# Altium footprint library FTP.PcbLib: 70 footprints (part 4 of 5)
Each footprint in its own frame and in the unit in brackets; x right, y up, seen from the top. Pads: shape width x height; smd on the part's side, far side on the other; paste and mask are expansions set on the pad; w line width, h text height; cw(c..) or ccw(c..) is an arc to the next point about the centre after c.
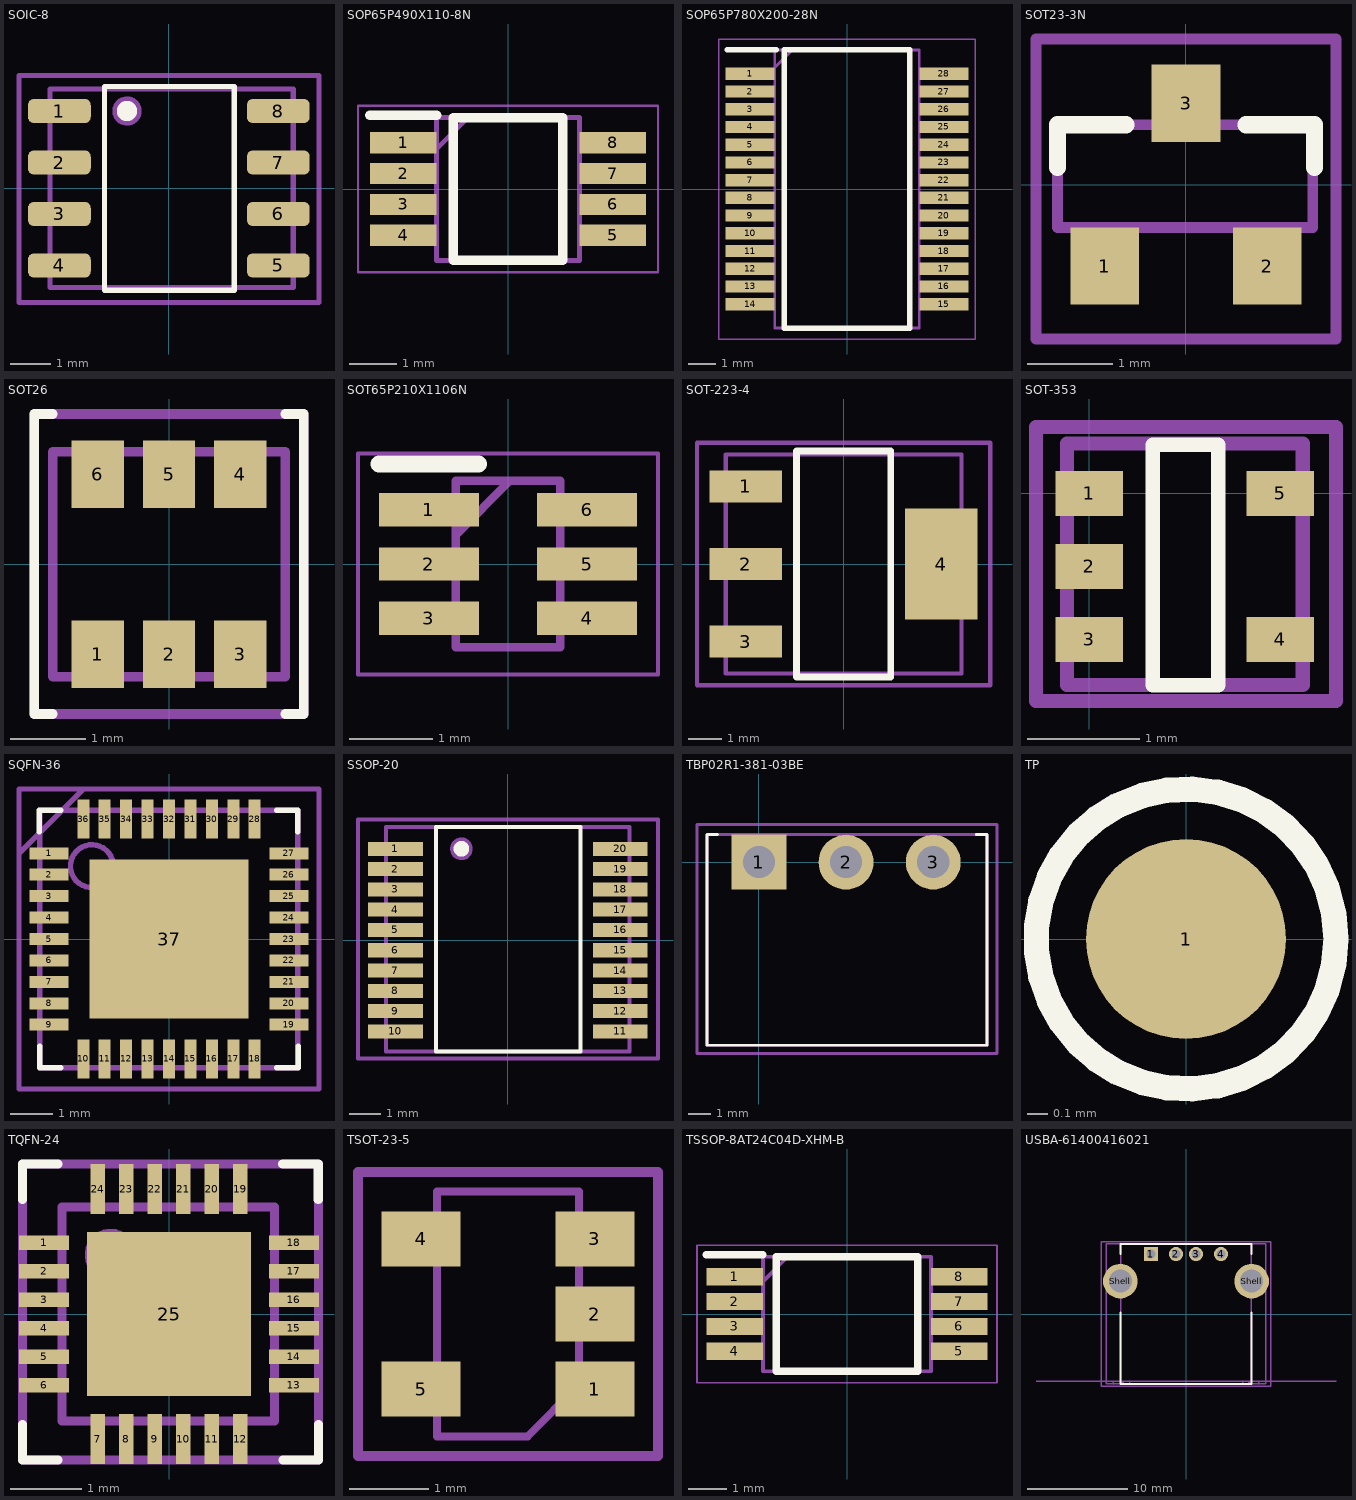
[diagram p3: the footprints below, top view; thin cyan lines are the x and y axes]

## SOIC-8 [mm]
pads (8):
  rrect50% 1.55x0.6 smd mask+0.07: 1(-2.7,1.905) 2(-2.7,0.635) 3(-2.7,-0.635) 4(-2.7,-1.905) 5(2.7,-1.905) 6(2.7,-0.635) 7(2.7,0.635) 8(2.7,1.905)
Top Overlay:
  circle w0.3: c-1.032,1.905 r0.1
  lines w0.127: -1.587,-2.516 -1.587,2.507 1.613,2.507 1.613,-2.516 -1.587,-2.516
  text "." at -4.6,2 h0.76
Mechanical 13:
  circle w0.127: c-1.032,1.905 r0.3
  lines w0.127: -2.932,-2.45 3.068,-2.45 3.068,2.45 -2.932,2.45 -2.932,-2.45
Mechanical 15:
  lines w0.127: -3.696,-2.818 -3.696,2.782 3.704,2.782 3.704,-2.818 -3.696,-2.818
  text "+" at -0.487,-0.757 h1.5
3D body "SOIC-8-1.step": height 1.75, standoff 0, extent -2.932,-2.45 3.068,2.45

## SOP65P490X110-8N [mm]
pads (8):
  rect 1.4x0.45 smd: 1(-2.2,0.975) 2(-2.2,0.325) 3(-2.2,-0.325) 4(-2.2,-0.975) 5(2.2,-0.975) 6(2.2,-0.325) 7(2.2,0.325) 8(2.2,0.975)
Top Overlay:
  lines w0.2: -2.9,1.55 -1.5,1.55 ; -1.15,-1.5 1.15,-1.5 1.15,1.5 -1.15,1.5 -1.15,-1.5
Mechanical 15:
  lines w0.1: -1.5,0.85 -0.85,1.5 ; -1.5,-1.5 1.5,-1.5 1.5,1.5 -1.5,1.5 -1.5,-1.5
Mechanical 20:
  lines w0.05: -3.15,-1.75 3.15,-1.75 3.15,1.75 -3.15,1.75 -3.15,-1.75
3D body "MCP7940NT-E_MS.stp": height 1.1, standoff 0, extent -2.45,-1.5 2.45,1.5

## SOP65P780X200-28N [mm]
pads (28):
  rect 1.8x0.45 smd: 1(-3.55,4.225) 2(-3.55,3.575) 3(-3.55,2.925) 4(-3.55,2.275) 5(-3.55,1.625) 6(-3.55,0.975) 7(-3.55,0.325) 8(-3.55,-0.325) 9(-3.55,-0.975) 10(-3.55,-1.625) 11(-3.55,-2.275) 12(-3.55,-2.925) 13(-3.55,-3.575) 14(-3.55,-4.225) 15(3.55,-4.225) 16(3.55,-3.575) 17(3.55,-2.925) 18(3.55,-2.275) 19(3.55,-1.625) 20(3.55,-0.975) 21(3.55,-0.325) 22(3.55,0.325) 23(3.55,0.975) 24(3.55,1.625) 25(3.55,2.275) 26(3.55,2.925) 27(3.55,3.575) 28(3.55,4.225)
Top Overlay:
  lines w0.2: -4.4,5.1 -2.6,5.1 ; -2.3,-5.1 -2.3,5.1 2.3,5.1 2.3,-5.1 -2.3,-5.1
Mechanical 15:
  lines w0.1: -2.65,4.45 -2,5.1 ; -2.65,-5.1 -2.65,5.1 2.65,5.1 2.65,-5.1 -2.65,-5.1
Mechanical 20:
  lines w0.05: -4.7,-5.5 -4.7,5.5 4.7,5.5 4.7,-5.5 -4.7,-5.5
3D body "PIC16F18857T-I_SS.stp": height 2, standoff 0, extent -3.9,-5.1 3.9,5.1

## SOT23-3N [mm] "SOT23, 3-Leads, Body 2.9x1.3mm, Pitch 0.95mm, Lead Span 2.5mm, IPC Medium Density"
height 1.1
pads (3):
  rect 0.8x0.9 smd: 1(-0.95,-0.95) 2(0.95,-0.95) 3(0,0.95)
Top Overlay:
  lines w0.2: -1.5,0.2 -1.5,0.7 -0.7,0.7 ; 0.7,0.7 1.5,0.7 1.5,0.2
  text "." at -0.874,-2.578 h0.76
Mechanical 13:
  lines w0.127: -1.5,-0.501 -1.5,0.7 1.5,0.7 1.479,0.679 1.479,-0.501 -1.5,-0.501
Mechanical 15:
  lines w0.127: -1.75,-1.8 1.75,-1.8 1.75,1.7 -1.75,1.7 -1.75,-1.8
  text "+" at 0.765,-0.501 h1.5
3D body "SOT23.step": height 0.91, standoff -0.04, extent -1.499,-1.197 1.401,1.204

## SOT26 [mm]
pads (6):
  rect 0.7x0.9 smd mask+0.07: 1(-0.95,-1.2) 2(0,-1.2) 3(0.95,-1.2) 4(0.95,1.2) 5(0,1.2) 6(-0.95,1.2)
Top Overlay:
  lines w0.127: -1.55,-2 -1.8,-2 -1.8,-0.85 -1.8,0.85 -1.8,2.007 -1.55,2.007 ; 1.55,-2 1.8,-2 1.8,-0.85 1.8,0.85 1.8,2.007 1.55,2.007
  text "." at -1.1,-2.4 h0.76
Mechanical 13:
  lines w0.127: -1.55,-1.5 -1.55,1.5 1.55,1.5 1.55,-1.5 -1.55,-1.5
Mechanical 15:
  lines w0.127: -1.8,-2 -1.8,2.007 1.8,2.007 1.8,0.85 1.8,-2 -1.8,-2
  text "+" at -0.493,-0.767 h1.5
3D body "ZXTC2045E6TA.step": height 1.4, standoff 0, extent -1.55,-1.5 1.55,1.5

## SOT65P210X1106N [mm]
pads (6):
  rect 1.2x0.4 smd: 1(-0.95,0.65) 2(-0.95,0) 3(-0.95,-0.65) 4(0.95,-0.65) 5(0.95,0) 6(0.95,0.65)
Top Overlay:
  lines w0.2: -1.55,1.2 -0.35,1.2
Mechanical 15:
  lines w0.1: -0.625,0.35 0.025,1 ; -0.625,-1 0.625,-1 0.625,1 -0.625,1 -0.625,-1
Mechanical 20:
  lines w0.05: -1.8,-1.325 1.8,-1.325 1.8,1.325 -1.8,1.325 -1.8,-1.325
3D body "SN74LVC2G07DCKT.stp": height 1, standoff 0, extent -1.05,-1 1.05,1

## SOT-223-4 [mm]
pads (4):
  rect 2.15x0.95 smd paste+0 mask+0.07: 1(-2.9,2.3) 2(-2.9,0) 3(-2.9,-2.3)
  rect 2.15x3.3 smd paste+0 mask+0.07: 4(2.9,0)
Top Overlay:
  lines w0.2: -1.4,-3.35 -1.4,3.35 1.4,3.35 1.4,-3.35 -1.4,-3.35
  text "." at -5.722,2.286 h0.76
Mechanical 13:
  lines w0.127: -3.5,-3.25 3.5,-3.25 3.5,3.25 -3.5,3.25 -3.5,-3.25
Mechanical 15:
  lines w0.127: -4.35,-3.6 -4.35,3.6 4.35,3.6 4.35,-3.6 -4.35,-3.6
  text "+" at 0.759,-0.515 h1.5
3D body "TLV1117LV33DCYR.stp": height 1.8, standoff 0, extent -3.5,-3.25 3.5,3.25

## SOT-353 [mm] "SOT23, 6-Leads, Body 2,90x2,80mm, Pitch 0,95mm, IPC Medium Density"
height 1
pads (5):
  rect 0.6x0.4 smd mask+0.07: 1(0,0) 2(0,-0.65) 3(0,-1.3) 4(1.7,-1.3) 5(1.7,0)
Top Overlay:
  lines w0.127: 0.563,-1.708 0.563,0.434 1.146,0.434 1.146,-1.708 0.563,-1.708
Mechanical 13:
  lines w0.127: -0.2,-1.706 -0.2,0.444 1.9,0.444 1.9,-1.706 -0.2,-1.706
Mechanical 15:
  lines w0.127: -0.476,-1.849 2.195,-1.849 2.195,0.591 -0.476,0.591 -0.476,-1.849
3D body "SOT353.stp": height 1.02, standoff -0.03, extent -0.2,-1.706 1.9,0.444

## SQFN-36 [mm]
pads (37):
  rect 0.9x0.28 smd: 1(-2.8,2) 2(-2.8,1.5) 3(-2.8,1) 4(-2.8,0.5) 5(-2.8,0) 6(-2.8,-0.5) 7(-2.8,-1) 8(-2.8,-1.5) 9(-2.8,-2) 19(2.8,-2) 20(2.8,-1.5) 21(2.8,-1) 22(2.8,-0.5) 23(2.8,0) 24(2.8,0.5) 25(2.8,1) 26(2.8,1.5) 27(2.8,2)
  rect 0.28x0.9 smd: 10(-2,-2.8) 11(-1.5,-2.8) 12(-1,-2.8) 13(-0.5,-2.8) 14(0,-2.8) 15(0.5,-2.8) 16(1,-2.8) 17(1.5,-2.8) 18(2,-2.8) 28(2,2.8) 29(1.5,2.8) 30(1,2.8) 31(0.5,2.8) 32(0,2.8) 33(-0.5,2.8) 34(-1,2.8) 35(-1.5,2.8) 36(-2,2.8)
  rrect0% 3.7x3.7 smd: 37(0,0)
Top Overlay:
  lines w0.127: -3.026,2.507 -3.026,3.005 -2.528,3.005 ; -3.018,-2.502 -3.018,-3 -2.52,-3 ; 2.51,2.999 3.008,2.999 3.008,2.501 ; 2.513,-3.001 3.011,-3.001 3.011,-2.503
  text "." at -4.2,2 h0.76
Mechanical 13:
  circle w0.127: c-1.8,1.7 r0.5
  lines w0.127: -3.018,-3 3.008,-3 3.008,2.999 -3.018,2.999 -3.018,-3
Mechanical 15:
  lines w0.127: -3.5,2 -2,3.5 ; -3.5,-3.5 -3.5,3.5 3.5,3.5 3.5,-3.5 -3.5,-3.5
  text "+" at -0.495,-0.751 h1.5
3D body "USB2514B_M2.stp": height 1, standoff 0, extent -3.05,-3.05 3.05,3.05

## SSOP-20 [mm]
pads (20):
  rect 1.75x0.45 smd mask+0.07: 1(-3.6,2.925) 2(-3.6,2.275) 3(-3.6,1.625) 4(-3.6,0.975) 5(-3.6,0.325) 6(-3.6,-0.325) 7(-3.6,-0.975) 8(-3.6,-1.625) 9(-3.6,-2.275) 10(-3.6,-2.925) 11(3.6,-2.925) 12(3.6,-2.275) 13(3.6,-1.625) 14(3.6,-0.975) 15(3.6,-0.325) 16(3.6,0.325) 17(3.6,0.975) 18(3.6,1.625) 19(3.6,2.275) 20(3.6,2.925)
Top Overlay:
  circle w0.3: c-1.487,2.925 r0.1
  lines w0.127: -2.3,-3.575 -2.3,3.625 2.328,3.625 2.328,-3.575 -2.3,-3.575
  text "." at -5.7,2.9 h0.76
Mechanical 13:
  circle w0.127: c-1.487,2.925 r0.3
  lines w0.127: -3.9,-3.575 3.9,-3.575 3.9,3.625 -3.9,3.625 -3.9,-3.575
Mechanical 15:
  lines w0.127: -4.8,-3.8 4.813,-3.8 4.813,3.87 -4.8,3.87 -4.8,-3.8
  text "+" at -0.489,-0.75 h1.5
3D body "PIC18F14K22-I_SS.stp": height 2, standoff 0, extent -3.876,-3.601 3.924,3.599

## TBP02R1-381-03BE [mm]
pads (3):
  rect 2.4x2.4 hole 1.4: 1(0,0)
  round 2.4 hole 1.4: 2(3.81,0) 3(7.62,0)
Top Overlay:
  lines w0.127: -1.8,1.2 -2.258,1.2 -2.258,-8 9.962,-8 9.962,1.2 9.5,1.2
  text "." at -0.5,3.5 h0.76
Mechanical 13:
  lines w0.127: -2.258,-8 -2.258,1.2 9.962,1.2 9.962,-8 -2.258,-8
Mechanical 15:
  lines w0.127: -2.7,-8.357 -2.7,1.643 10.405,1.643 10.405,-8.357 -2.7,-8.357
3D body "CUI_DEVICES_TBP02R1-381-03BE.step": height 7.2, standoff -3.5, extent -2.258,-8 9.962,1.2

## TP [mm]
pads (1):
  round 1 smd paste-2 mask+0.1: 1(0,0)
Top Overlay:
  circle w0.127: c0,0 r0.75

## TQFN-24 [mm]
pads (25):
  rect 0.7x0.2 smd mask+0.07: 1(-1.753,1) 2(-1.753,0.6) 3(-1.753,0.2) 4(-1.753,-0.2) 5(-1.753,-0.6) 6(-1.753,-1) 13(1.753,-1) 14(1.753,-0.6) 15(1.753,-0.2) 16(1.753,0.2) 17(1.753,0.6) 18(1.753,1)
  rect 0.2x0.7 smd mask+0.07: 7(-1,-1.753) 8(-0.6,-1.753) 9(-0.2,-1.753) 10(0.2,-1.753) 11(0.6,-1.753) 12(1,-1.753) 19(1,1.753) 20(0.6,1.753) 21(0.2,1.753) 22(-0.2,1.753) 23(-0.6,1.753) 24(-1,1.753)
  rect 2.3x2.3 smd mask+0.07: 25(0,0)
Top Overlay:
  lines w0.127: -2.057,-1.55 -2.057,-2.048 -1.558,-2.048 ; -2.056,1.606 -2.056,2.104 -1.558,2.104 ; 1.595,2.105 2.093,2.105 2.093,1.607 ; 1.597,-2.045 2.096,-2.045 2.096,-1.547
  text "." at -2.8,1 h0.76
Mechanical 13:
  circle w0.127: c-0.818,0.833 r0.3
  lines w0.127: -1.5,-1.5 1.477,-1.5 1.477,1.5 -1.5,1.5 -1.5,-1.5
Mechanical 15:
  lines w0.127: -2.057,-2.048 2.096,-2.048 2.096,2.105 -2.057,2.105 -2.057,-2.048
  text "+" at -0.497,-0.745 h1.5
3D body "User Library-24 QFN 3x3.step": height 0.98, standoff -0.02, extent -1.5,-1.5 1.5,1.5

## TSOT-23-5 [mm]
pads (5):
  rect 1x0.7 smd paste-0.05 mask+0.07: 1(-7.433,-21.006) 2(-7.433,-20.056) 3(-7.433,-19.106) 4(-9.633,-19.106) 5(-9.633,-21.006)
Mechanical 13:
  lines w0.1: -9.433,-21.606 -9.433,-18.506 -7.633,-18.506 -7.633,-20.956 -8.283,-21.606 -9.433,-21.606
Mechanical 15:
  lines w0.127: -10.433,-21.856 -6.633,-21.856 -6.633,-18.256 -10.433,-18.256 -10.433,-21.856
3D body "SOT-23-5.STEP": height 1.46, standoff 0, extent -10,-21.556 -7,-18.556

## TSSOP-8AT24C04D-XHM-B [mm]
pads (8):
  rect 1.475x0.45 smd: 1(-2.938,0.975) 2(-2.938,0.325) 3(-2.938,-0.325) 4(-2.938,-0.975) 5(2.938,-0.975) 6(2.938,-0.325) 7(2.938,0.325) 8(2.938,0.975)
Top Overlay:
  lines w0.2: -3.675,1.55 -2.2,1.55 ; -1.85,-1.5 1.85,-1.5 1.85,1.5 -1.85,1.5 -1.85,-1.5
Mechanical 15:
  lines w0.1: -2.2,0.85 -1.55,1.5 ; -2.2,-1.5 2.2,-1.5 2.2,1.5 -2.2,1.5 -2.2,-1.5
Mechanical 20:
  lines w0.05: -3.925,-1.8 3.925,-1.8 3.925,1.8 -3.925,1.8 -3.925,-1.8
3D body "AT24C04D-XHM-B.stp": height 1.2, standoff 0, extent -3.4,-1.5 3,1.5

## USBA-61400416021 [mm]
height 6.9
pads (6):
  rect 1.42x1.42 hole 0.92: 1(-3.5,5.99)
  round 1.42 hole 0.92: 2(-1,5.99) 3(1,5.99) 4(3.5,5.99)
  round 3.45 hole 2.3: Shell(-6.57,3.28) Shell(6.57,3.28)
Top Overlay:
  lines w0.2: -6.55,0.15 -6.55,-7 6.55,-7 6.55,0.15 ; -6.55,5.99 -6.55,7 6.55,7 6.55,5.99
  text "." at -3.5,8.1 h0.76
Mechanical 6:
  lines w0.127: -15,-6.7 15,-6.7
Mechanical 13:
  lines w0.127: -7.25,-7 -6.56,-7 ccw(c-6.55,-6.7) -6.25,-6.7 -5.65,-6.7 -5.65,-7 5.65,-7 5.65,-6.7 6.25,-6.7 ccw(c6.55,-6.7) 6.56,-7 7.25,-7 7.25,-6.7 6.55,-6.7 6.55,7 -6.55,7 -6.55,-6.7 -7.25,-6.7 -7.25,-7
Mechanical 15:
  lines w0.127: -8.495,-7.2 8.495,-7.2 8.495,7.2 -8.495,7.2 -8.495,-7.2 ; -6.55,-7 6.55,-7 6.55,7 -6.55,7 -6.55,-7
  text "+" at -0.493,-0.767 h1.5
Mechanical 16:
  lines w0.127: -7.999,-7 7.999,-7 7.999,7 -7.999,7 -7.999,-7
3D body "61400416021.stp": height 7.63, standoff -4.06, extent -7.999,-7 7.999,7